# Altium schematic symbol library MCU_ST_STM32L4.SchLib: 319 symbols (part 6 of 8) (continued)
## STM32L471ZGJx
designator *  value STM32L471ZGJx  Reference: U
ki_keywords: Arm Cortex-M4 STM32L4 STM32L4x1; ki_description: STMicroelectronics Arm Cortex-M4 MCU, 1024KB flash, 128KB RAM, 80 MHz, 1.71-3.6V, 114 GPIO, UFBGA144; ki_fp_filters: *UFBGA*10x10mm*Layout12x12*P0.8mm*; Footprint: Package_BGA:UFBGA-144_10x10mm_Layout12x12_P0.8mm; Datasheet: https://www.st.com/resource/en/datasheet/stm32l471zg.pdf
pins: A1 VSS, A2 PE0, A3 PB8, A4 BOOT0, A5 PB7, A6 PG14, A7 PG12, A8 PD7, A9 PD6, A10 PD1, A11 PD0, A12 VSS hidden, B1 VBAT, B2 PE4, B3 PE3, B4 PE1, B5 PB6, B6 PG15, B7 PG11, B8 PD5, B9 PC12, B10 PC10, B11 PA12, B12 PA11, C1 PC15, C2 PE5, C3 PE2, C4 PB9, C5 PB5, C6 PB3, C7 PG9, C8 PD4, C9 PC11, C10 PA14, C11 PA13, C12 PA10, D1 PF4, D2 PC14, D3 PE6, D4 PC13, D5 PB4, D6 PG13, D7 PG10, D8 PD3, D9 PD2, D10 PA15, D11 PA9, D12 PA8, E1 PF6, E2 PF1, E3 PF0, E4 PF2, E5 VSS hidden, E6 VDDIO2, E7 VDD, E8 VSS hidden, E9 VDD, E10 PC6, E11 PC9, E12 PC8, F1 PF8, F2 PF7, F3 PF5, F4 PF3, F5 VDD, F6 VSS hidden, F7 VSS hidden, F8 VDDIO2, F9 PG7, F10 PG6, F11 PG8, F12 PC7, G1 PH1, G2 PH0, G3 PF10, G4 PF9, G5 VDD, G6 VSS hidden, G7 VSS hidden, G8 VDD, G9 PG4, G10 PD13, G11 PG3, G12 PG5, H1 PC2, H2 PC0, H3 PC1, H4 NRST, H5 VSS hidden, H6 VDD, H7 VDD, H8 VSS hidden, H9 PD12, H10 PD11, H11 PD14, H12 PG2, J1 VSSA, J2 VREF-, J3 PA0, J4 PC3, J5 PC4, J6 PF11, J7 PG1, J8 PE9, J9 PB13, J10 PB14, J11 PD10, J12 PD15, K1 VREF+, K2 VDDA, K3 PA1, K4 PA6, K5 PB2, K6 PF12, K7 PG0, K8 PE11, K9 PB11, K10 PB12, K11 PD8, K12 PD9, L1 OPAMP1_VINM, L2 PA2, L3 PA4, L4 OPAMP2_VINM, L5 PB0, L6 PF13, L7 PE8, L8 PE12, L9 PE13, L10 PE14, L11 PB10, L12 PB15, M1 VSS hidden, M2 PA3, M3 PA5, M4 PA7, M5 PC5, M6 PB1, M7 PF14, M8 PE7, M9 PF15, M10 PE10, M11 PE15, M12 VSS hidden

## STM32L471ZGTx
designator *  value STM32L471ZGTx  Reference: U
ki_keywords: Arm Cortex-M4 STM32L4 STM32L4x1; ki_description: STMicroelectronics Arm Cortex-M4 MCU, 1024KB flash, 128KB RAM, 80 MHz, 1.71-3.6V, 114 GPIO, LQFP144; ki_fp_filters: LQFP*20x20mm*P0.5mm*; Footprint: Package_QFP:LQFP-144_20x20mm_P0.5mm; Datasheet: https://www.st.com/resource/en/datasheet/stm32l471zg.pdf
pins: 1 PE2, 2 PE3, 3 PE4, 4 PE5, 5 PE6, 6 VBAT, 7 PC13, 8 PC14, 9 PC15, 10 PF0, 11 PF1, 12 PF2, 13 PF3, 14 PF4, 15 PF5, 16 VSS, 17 VDD, 18 PF6, 19 PF7, 20 PF8, 21 PF9, 22 PF10, 23 PH0, 24 PH1, 25 NRST, 26 PC0, 27 PC1, 28 PC2, 29 PC3, 30 VSSA, 31 VREF-, 32 VREF+, 33 VDDA, 34 PA0, 35 PA1, 36 PA2, 37 PA3, 38 VSS hidden, 39 VDD, 40 PA4, 41 PA5, 42 PA6, 43 PA7, 44 PC4, 45 PC5, 46 PB0, 47 PB1, 48 PB2, 49 PF11, 50 PF12, 51 VSS hidden, 52 VDD, 53 PF13, 54 PF14, 55 PF15, 56 PG0, 57 PG1, 58 PE7, 59 PE8, 60 PE9, 61 VSS hidden, 62 VDD, 63 PE10, 64 PE11, 65 PE12, 66 PE13, 67 PE14, 68 PE15, 69 PB10, 70 PB11, 71 VSS hidden, 72 VDD, 73 PB12, 74 PB13, 75 PB14, 76 PB15, 77 PD8, 78 PD9, 79 PD10, 80 PD11, 81 PD12, 82 PD13, 83 VSS hidden, 84 VDD, 85 PD14, 86 PD15, 87 PG2, 88 PG3, 89 PG4, 90 PG5, 91 PG6, 92 PG7, 93 PG8, 94 VSS hidden, 95 VDDIO2, 96 PC6, 97 PC7, 98 PC8, 99 PC9, 100 PA8, 101 PA9, 102 PA10, 103 PA11, 104 PA12, 105 PA13, 106 VDD, 107 VSS hidden, 108 VDD, 109 PA14, 110 PA15, 111 PC10, 112 PC11, 113 PC12, 114 PD0, 115 PD1, 116 PD2, 117 PD3, 118 PD4, 119 PD5, 120 VSS hidden, 121 VDD, 122 PD6, 123 PD7, 124 PG9, 125 PG10, 126 PG11, 127 PG12, 128 PG13, 129 PG14, 130 VSS hidden, 131 VDDIO2, 132 PG15, 133 PB3, 134 PB4, 135 PB5, 136 PB6, 137 PB7, 138 BOOT0, 139 PB8, 140 PB9, 141 PE0, 142 PE1, 143 VSS hidden, 144 VDD

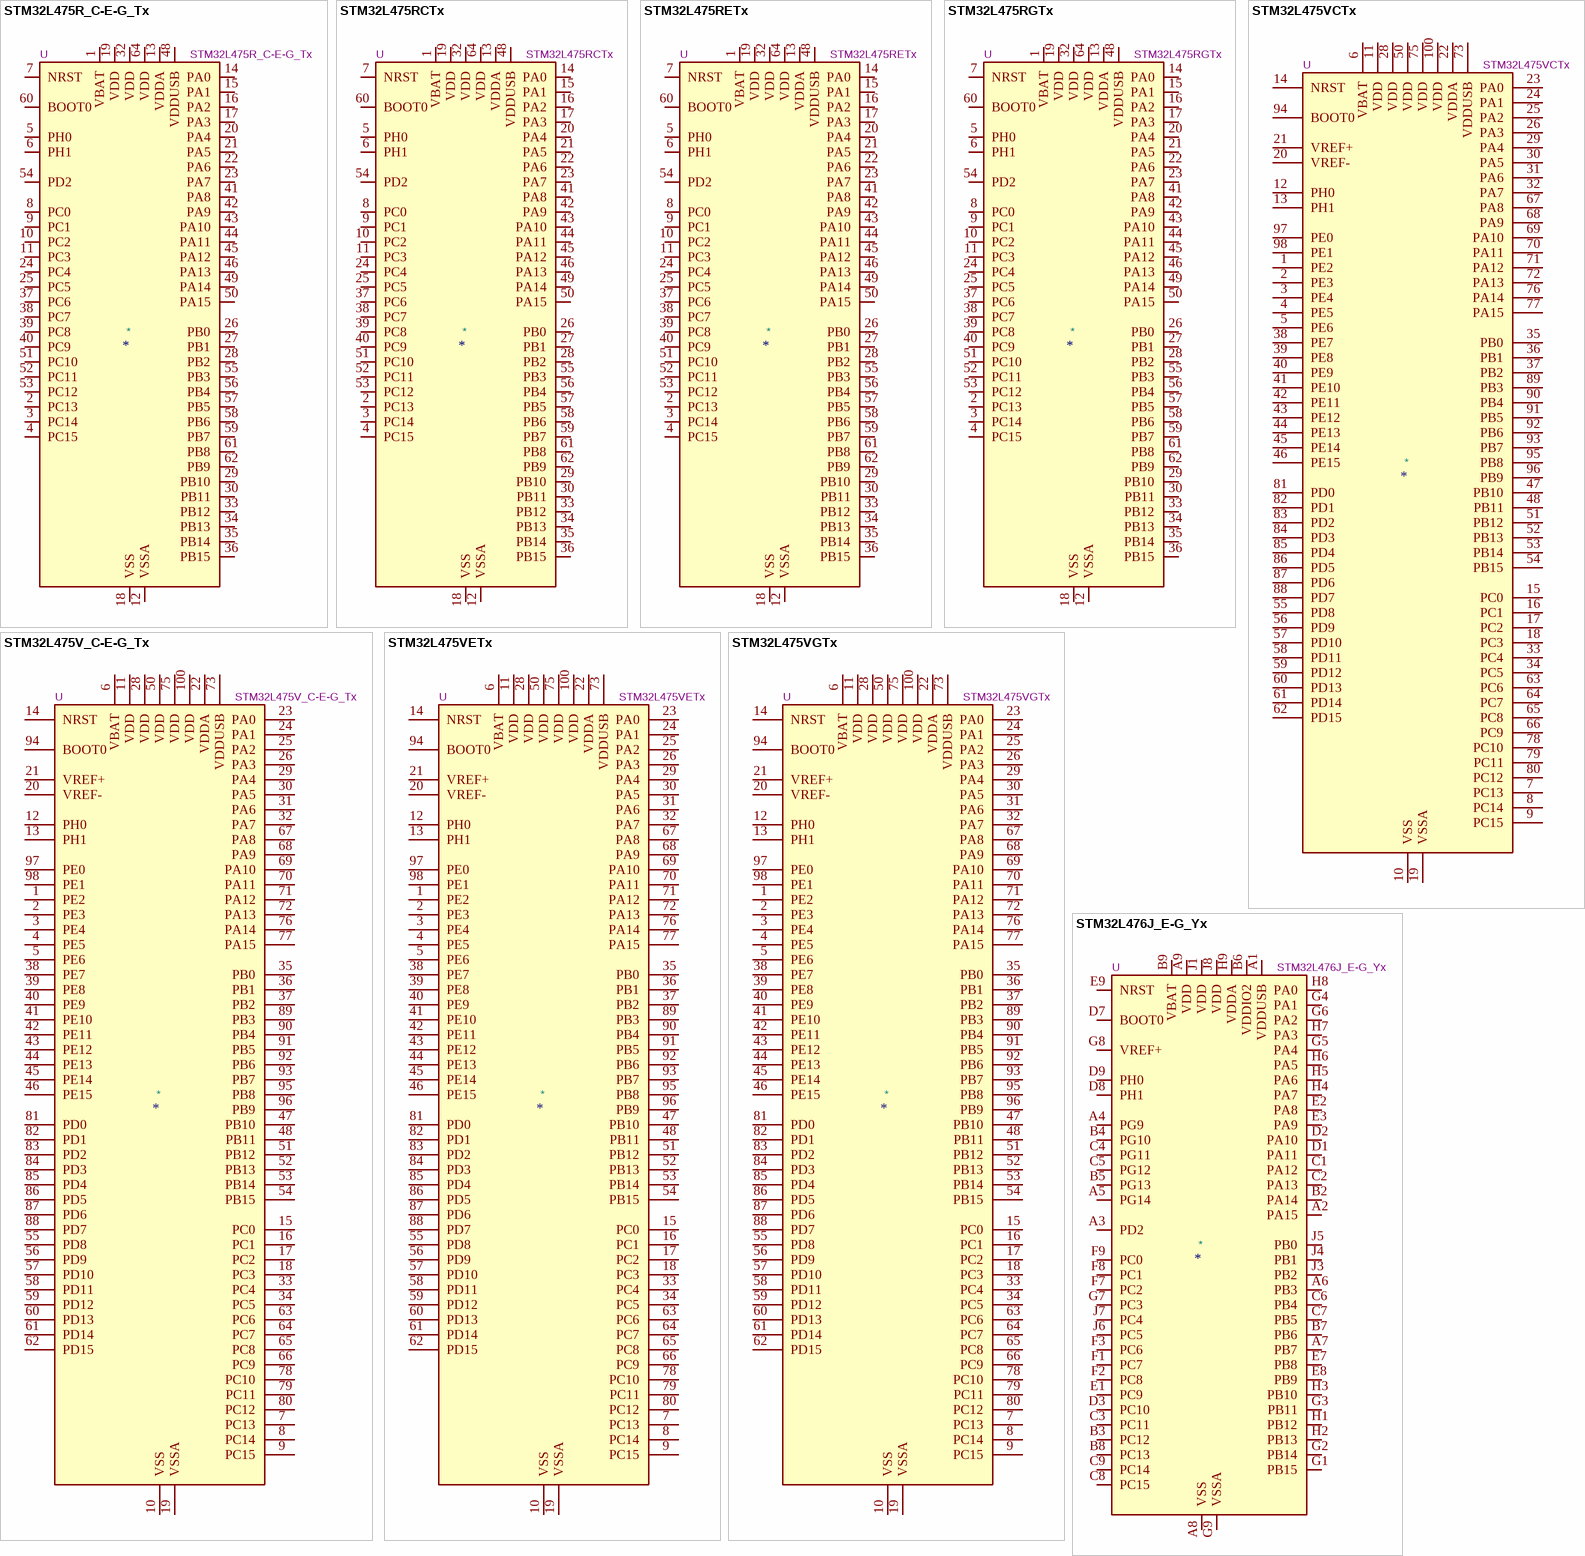
[diagram p48: symbols STM32L475R_C-E-G_Tx to STM32L476J_E-G_Yx]

## STM32L475R_C-E-G_Tx
designator *  value STM32L475R_C-E-G_Tx  Reference: U
ki_keywords: Arm Cortex-M4 STM32L4 STM32L4x5; ki_description: STMicroelectronics Arm Cortex-M4 MCU, 256-1024KB flash, 128KB RAM, 80 MHz, 1.71-3.6V, 51 GPIO, LQFP64; ki_fp_filters: LQFP*10x10mm*P0.5mm*; Footprint: Package_QFP:LQFP-64_10x10mm_P0.5mm; Datasheet: https://www.st.com/resource/en/datasheet/stm32l475rc.pdf
pins: 1 VBAT, 2 PC13, 3 PC14, 4 PC15, 5 PH0, 6 PH1, 7 NRST, 8 PC0, 9 PC1, 10 PC2, 11 PC3, 12 VSSA, 13 VDDA, 14 PA0, 15 PA1, 16 PA2, 17 PA3, 18 VSS, 19 VDD, 20 PA4, 21 PA5, 22 PA6, 23 PA7, 24 PC4, 25 PC5, 26 PB0, 27 PB1, 28 PB2, 29 PB10, 30 PB11, 31 VSS hidden, 32 VDD, 33 PB12, 34 PB13, 35 PB14, 36 PB15, 37 PC6, 38 PC7, 39 PC8, 40 PC9, 41 PA8, 42 PA9, 43 PA10, 44 PA11, 45 PA12, 46 PA13, 47 VSS hidden, 48 VDDUSB, 49 PA14, 50 PA15, 51 PC10, 52 PC11, 53 PC12, 54 PD2, 55 PB3, 56 PB4, 57 PB5, 58 PB6, 59 PB7, 60 BOOT0, 61 PB8, 62 PB9, 63 VSS hidden, 64 VDD

## STM32L475RCTx
designator *  value STM32L475RCTx  Reference: U
ki_keywords: Arm Cortex-M4 STM32L4 STM32L4x5; ki_description: STMicroelectronics Arm Cortex-M4 MCU, 256KB flash, 128KB RAM, 80 MHz, 1.71-3.6V, 51 GPIO, LQFP64; ki_fp_filters: LQFP*10x10mm*P0.5mm*; Footprint: Package_QFP:LQFP-64_10x10mm_P0.5mm; Datasheet: https://www.st.com/resource/en/datasheet/stm32l475rc.pdf
pins: 1 VBAT, 2 PC13, 3 PC14, 4 PC15, 5 PH0, 6 PH1, 7 NRST, 8 PC0, 9 PC1, 10 PC2, 11 PC3, 12 VSSA, 13 VDDA, 14 PA0, 15 PA1, 16 PA2, 17 PA3, 18 VSS, 19 VDD, 20 PA4, 21 PA5, 22 PA6, 23 PA7, 24 PC4, 25 PC5, 26 PB0, 27 PB1, 28 PB2, 29 PB10, 30 PB11, 31 VSS hidden, 32 VDD, 33 PB12, 34 PB13, 35 PB14, 36 PB15, 37 PC6, 38 PC7, 39 PC8, 40 PC9, 41 PA8, 42 PA9, 43 PA10, 44 PA11, 45 PA12, 46 PA13, 47 VSS hidden, 48 VDDUSB, 49 PA14, 50 PA15, 51 PC10, 52 PC11, 53 PC12, 54 PD2, 55 PB3, 56 PB4, 57 PB5, 58 PB6, 59 PB7, 60 BOOT0, 61 PB8, 62 PB9, 63 VSS hidden, 64 VDD

## STM32L475RETx
designator *  value STM32L475RETx  Reference: U
ki_keywords: Arm Cortex-M4 STM32L4 STM32L4x5; ki_description: STMicroelectronics Arm Cortex-M4 MCU, 512KB flash, 128KB RAM, 80 MHz, 1.71-3.6V, 51 GPIO, LQFP64; ki_fp_filters: LQFP*10x10mm*P0.5mm*; Footprint: Package_QFP:LQFP-64_10x10mm_P0.5mm; Datasheet: https://www.st.com/resource/en/datasheet/stm32l475re.pdf
pins: 1 VBAT, 2 PC13, 3 PC14, 4 PC15, 5 PH0, 6 PH1, 7 NRST, 8 PC0, 9 PC1, 10 PC2, 11 PC3, 12 VSSA, 13 VDDA, 14 PA0, 15 PA1, 16 PA2, 17 PA3, 18 VSS, 19 VDD, 20 PA4, 21 PA5, 22 PA6, 23 PA7, 24 PC4, 25 PC5, 26 PB0, 27 PB1, 28 PB2, 29 PB10, 30 PB11, 31 VSS hidden, 32 VDD, 33 PB12, 34 PB13, 35 PB14, 36 PB15, 37 PC6, 38 PC7, 39 PC8, 40 PC9, 41 PA8, 42 PA9, 43 PA10, 44 PA11, 45 PA12, 46 PA13, 47 VSS hidden, 48 VDDUSB, 49 PA14, 50 PA15, 51 PC10, 52 PC11, 53 PC12, 54 PD2, 55 PB3, 56 PB4, 57 PB5, 58 PB6, 59 PB7, 60 BOOT0, 61 PB8, 62 PB9, 63 VSS hidden, 64 VDD

## STM32L475RGTx
designator *  value STM32L475RGTx  Reference: U
ki_keywords: Arm Cortex-M4 STM32L4 STM32L4x5; ki_description: STMicroelectronics Arm Cortex-M4 MCU, 1024KB flash, 128KB RAM, 80 MHz, 1.71-3.6V, 51 GPIO, LQFP64; ki_fp_filters: LQFP*10x10mm*P0.5mm*; Footprint: Package_QFP:LQFP-64_10x10mm_P0.5mm; Datasheet: https://www.st.com/resource/en/datasheet/stm32l475rg.pdf
pins: 1 VBAT, 2 PC13, 3 PC14, 4 PC15, 5 PH0, 6 PH1, 7 NRST, 8 PC0, 9 PC1, 10 PC2, 11 PC3, 12 VSSA, 13 VDDA, 14 PA0, 15 PA1, 16 PA2, 17 PA3, 18 VSS, 19 VDD, 20 PA4, 21 PA5, 22 PA6, 23 PA7, 24 PC4, 25 PC5, 26 PB0, 27 PB1, 28 PB2, 29 PB10, 30 PB11, 31 VSS hidden, 32 VDD, 33 PB12, 34 PB13, 35 PB14, 36 PB15, 37 PC6, 38 PC7, 39 PC8, 40 PC9, 41 PA8, 42 PA9, 43 PA10, 44 PA11, 45 PA12, 46 PA13, 47 VSS hidden, 48 VDDUSB, 49 PA14, 50 PA15, 51 PC10, 52 PC11, 53 PC12, 54 PD2, 55 PB3, 56 PB4, 57 PB5, 58 PB6, 59 PB7, 60 BOOT0, 61 PB8, 62 PB9, 63 VSS hidden, 64 VDD

## STM32L475V_C-E-G_Tx
designator *  value STM32L475V_C-E-G_Tx  Reference: U
ki_keywords: Arm Cortex-M4 STM32L4 STM32L4x5; ki_description: STMicroelectronics Arm Cortex-M4 MCU, 256-1024KB flash, 128KB RAM, 80 MHz, 1.71-3.6V, 82 GPIO, LQFP100; ki_fp_filters: LQFP*14x14mm*P0.5mm*; Footprint: Package_QFP:LQFP-100_14x14mm_P0.5mm; Datasheet: https://www.st.com/resource/en/datasheet/stm32l475vc.pdf
pins: 1 PE2, 2 PE3, 3 PE4, 4 PE5, 5 PE6, 6 VBAT, 7 PC13, 8 PC14, 9 PC15, 10 VSS, 11 VDD, 12 PH0, 13 PH1, 14 NRST, 15 PC0, 16 PC1, 17 PC2, 18 PC3, 19 VSSA, 20 VREF-, 21 VREF+, 22 VDDA, 23 PA0, 24 PA1, 25 PA2, 26 PA3, 27 VSS hidden, 28 VDD, 29 PA4, 30 PA5, 31 PA6, 32 PA7, 33 PC4, 34 PC5, 35 PB0, 36 PB1, 37 PB2, 38 PE7, 39 PE8, 40 PE9, 41 PE10, 42 PE11, 43 PE12, 44 PE13, 45 PE14, 46 PE15, 47 PB10, 48 PB11, 49 VSS hidden, 50 VDD, 51 PB12, 52 PB13, 53 PB14, 54 PB15, 55 PD8, 56 PD9, 57 PD10, 58 PD11, 59 PD12, 60 PD13, 61 PD14, 62 PD15, 63 PC6, 64 PC7, 65 PC8, 66 PC9, 67 PA8, 68 PA9, 69 PA10, 70 PA11, 71 PA12, 72 PA13, 73 VDDUSB, 74 VSS hidden, 75 VDD, 76 PA14, 77 PA15, 78 PC10, 79 PC11, 80 PC12, 81 PD0, 82 PD1, 83 PD2, 84 PD3, 85 PD4, 86 PD5, 87 PD6, 88 PD7, 89 PB3, 90 PB4, 91 PB5, 92 PB6, 93 PB7, 94 BOOT0, 95 PB8, 96 PB9, 97 PE0, 98 PE1, 99 VSS hidden, 100 VDD

## STM32L475VCTx
designator *  value STM32L475VCTx  Reference: U
ki_keywords: Arm Cortex-M4 STM32L4 STM32L4x5; ki_description: STMicroelectronics Arm Cortex-M4 MCU, 256KB flash, 128KB RAM, 80 MHz, 1.71-3.6V, 82 GPIO, LQFP100; ki_fp_filters: LQFP*14x14mm*P0.5mm*; Footprint: Package_QFP:LQFP-100_14x14mm_P0.5mm; Datasheet: https://www.st.com/resource/en/datasheet/stm32l475vc.pdf
pins: 1 PE2, 2 PE3, 3 PE4, 4 PE5, 5 PE6, 6 VBAT, 7 PC13, 8 PC14, 9 PC15, 10 VSS, 11 VDD, 12 PH0, 13 PH1, 14 NRST, 15 PC0, 16 PC1, 17 PC2, 18 PC3, 19 VSSA, 20 VREF-, 21 VREF+, 22 VDDA, 23 PA0, 24 PA1, 25 PA2, 26 PA3, 27 VSS hidden, 28 VDD, 29 PA4, 30 PA5, 31 PA6, 32 PA7, 33 PC4, 34 PC5, 35 PB0, 36 PB1, 37 PB2, 38 PE7, 39 PE8, 40 PE9, 41 PE10, 42 PE11, 43 PE12, 44 PE13, 45 PE14, 46 PE15, 47 PB10, 48 PB11, 49 VSS hidden, 50 VDD, 51 PB12, 52 PB13, 53 PB14, 54 PB15, 55 PD8, 56 PD9, 57 PD10, 58 PD11, 59 PD12, 60 PD13, 61 PD14, 62 PD15, 63 PC6, 64 PC7, 65 PC8, 66 PC9, 67 PA8, 68 PA9, 69 PA10, 70 PA11, 71 PA12, 72 PA13, 73 VDDUSB, 74 VSS hidden, 75 VDD, 76 PA14, 77 PA15, 78 PC10, 79 PC11, 80 PC12, 81 PD0, 82 PD1, 83 PD2, 84 PD3, 85 PD4, 86 PD5, 87 PD6, 88 PD7, 89 PB3, 90 PB4, 91 PB5, 92 PB6, 93 PB7, 94 BOOT0, 95 PB8, 96 PB9, 97 PE0, 98 PE1, 99 VSS hidden, 100 VDD

## STM32L475VETx
designator *  value STM32L475VETx  Reference: U
ki_keywords: Arm Cortex-M4 STM32L4 STM32L4x5; ki_description: STMicroelectronics Arm Cortex-M4 MCU, 512KB flash, 128KB RAM, 80 MHz, 1.71-3.6V, 82 GPIO, LQFP100; ki_fp_filters: LQFP*14x14mm*P0.5mm*; Footprint: Package_QFP:LQFP-100_14x14mm_P0.5mm; Datasheet: https://www.st.com/resource/en/datasheet/stm32l475ve.pdf
pins: 1 PE2, 2 PE3, 3 PE4, 4 PE5, 5 PE6, 6 VBAT, 7 PC13, 8 PC14, 9 PC15, 10 VSS, 11 VDD, 12 PH0, 13 PH1, 14 NRST, 15 PC0, 16 PC1, 17 PC2, 18 PC3, 19 VSSA, 20 VREF-, 21 VREF+, 22 VDDA, 23 PA0, 24 PA1, 25 PA2, 26 PA3, 27 VSS hidden, 28 VDD, 29 PA4, 30 PA5, 31 PA6, 32 PA7, 33 PC4, 34 PC5, 35 PB0, 36 PB1, 37 PB2, 38 PE7, 39 PE8, 40 PE9, 41 PE10, 42 PE11, 43 PE12, 44 PE13, 45 PE14, 46 PE15, 47 PB10, 48 PB11, 49 VSS hidden, 50 VDD, 51 PB12, 52 PB13, 53 PB14, 54 PB15, 55 PD8, 56 PD9, 57 PD10, 58 PD11, 59 PD12, 60 PD13, 61 PD14, 62 PD15, 63 PC6, 64 PC7, 65 PC8, 66 PC9, 67 PA8, 68 PA9, 69 PA10, 70 PA11, 71 PA12, 72 PA13, 73 VDDUSB, 74 VSS hidden, 75 VDD, 76 PA14, 77 PA15, 78 PC10, 79 PC11, 80 PC12, 81 PD0, 82 PD1, 83 PD2, 84 PD3, 85 PD4, 86 PD5, 87 PD6, 88 PD7, 89 PB3, 90 PB4, 91 PB5, 92 PB6, 93 PB7, 94 BOOT0, 95 PB8, 96 PB9, 97 PE0, 98 PE1, 99 VSS hidden, 100 VDD

## STM32L475VGTx
designator *  value STM32L475VGTx  Reference: U
ki_keywords: Arm Cortex-M4 STM32L4 STM32L4x5; ki_description: STMicroelectronics Arm Cortex-M4 MCU, 1024KB flash, 128KB RAM, 80 MHz, 1.71-3.6V, 82 GPIO, LQFP100; ki_fp_filters: LQFP*14x14mm*P0.5mm*; Footprint: Package_QFP:LQFP-100_14x14mm_P0.5mm; Datasheet: https://www.st.com/resource/en/datasheet/stm32l475vg.pdf
pins: 1 PE2, 2 PE3, 3 PE4, 4 PE5, 5 PE6, 6 VBAT, 7 PC13, 8 PC14, 9 PC15, 10 VSS, 11 VDD, 12 PH0, 13 PH1, 14 NRST, 15 PC0, 16 PC1, 17 PC2, 18 PC3, 19 VSSA, 20 VREF-, 21 VREF+, 22 VDDA, 23 PA0, 24 PA1, 25 PA2, 26 PA3, 27 VSS hidden, 28 VDD, 29 PA4, 30 PA5, 31 PA6, 32 PA7, 33 PC4, 34 PC5, 35 PB0, 36 PB1, 37 PB2, 38 PE7, 39 PE8, 40 PE9, 41 PE10, 42 PE11, 43 PE12, 44 PE13, 45 PE14, 46 PE15, 47 PB10, 48 PB11, 49 VSS hidden, 50 VDD, 51 PB12, 52 PB13, 53 PB14, 54 PB15, 55 PD8, 56 PD9, 57 PD10, 58 PD11, 59 PD12, 60 PD13, 61 PD14, 62 PD15, 63 PC6, 64 PC7, 65 PC8, 66 PC9, 67 PA8, 68 PA9, 69 PA10, 70 PA11, 71 PA12, 72 PA13, 73 VDDUSB, 74 VSS hidden, 75 VDD, 76 PA14, 77 PA15, 78 PC10, 79 PC11, 80 PC12, 81 PD0, 82 PD1, 83 PD2, 84 PD3, 85 PD4, 86 PD5, 87 PD6, 88 PD7, 89 PB3, 90 PB4, 91 PB5, 92 PB6, 93 PB7, 94 BOOT0, 95 PB8, 96 PB9, 97 PE0, 98 PE1, 99 VSS hidden, 100 VDD

## STM32L476J_E-G_Yx
designator *  value STM32L476J_E-G_Yx  Reference: U
ki_keywords: Arm Cortex-M4 STM32L4 STM32L4x6; ki_description: STMicroelectronics Arm Cortex-M4 MCU, 512-1024KB flash, 128KB RAM, 80 MHz, 1.71-3.6V, 57 GPIO, WLCSP72; ki_fp_filters: ST*WLCSP*Die415*; Footprint: Package_CSP:ST_WLCSP-72_Die415; Datasheet: https://www.st.com/resource/en/datasheet/stm32l476je.pdf
pins: A1 VDDUSB, A2 PA15, A3 PD2, A4 PG9, A5 PG14, A6 PB3, A7 PB7, A8 VSS, A9 VDD, B1 VSS hidden, B2 PA14, B3 PC12, B4 PG10, B5 PG13, B6 VDDIO2, B7 PB6, B8 PC13, B9 VBAT, C1 PA12, C2 PA13, C3 PC11, C4 PG11, C5 PG12, C6 PB4, C7 PB5, C8 PC15, C9 PC14, D1 PA11, D2 PA10, D3 PC10, D7 BOOT0, D8 PH1, D9 PH0, E1 PC9, E2 PA8, E3 PA9, E7 PB8, E8 PB9, E9 NRST, F1 PC7, F2 PC8, F3 PC6, F7 PC2, F8 PC1, F9 PC0, G1 PB15, G2 PB14, G3 PB11, G4 PA1, G5 PA4, G6 PA2, G7 PC3, G8 VREF+, G9 VSSA, H1 PB12, H2 PB13, H3 PB10, H4 PA7, H5 PA6, H6 PA5, H7 PA3, H8 PA0, H9 VDDA, J1 VDD, J2 VSS hidden, J3 PB2, J4 PB1, J5 PB0, J6 PC5, J7 PC4, J8 VDD, J9 VSS hidden

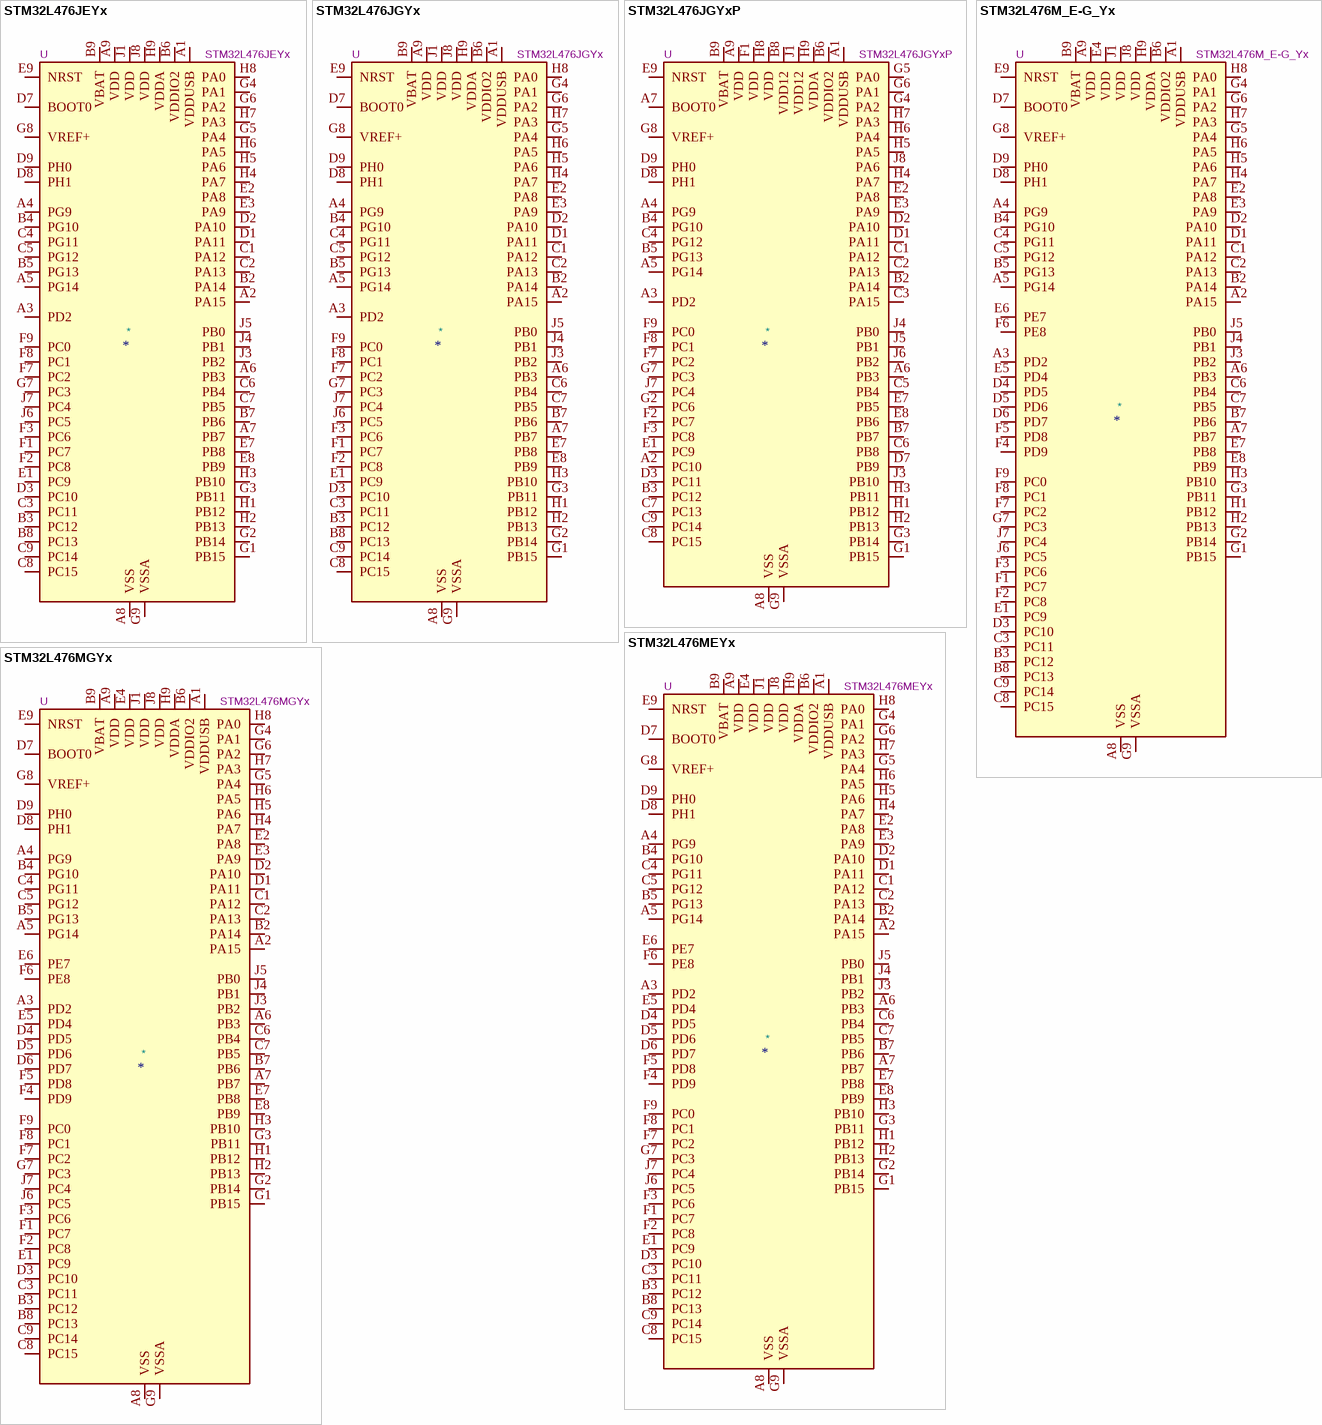
[diagram p49: symbols STM32L476JEYx to STM32L476MGYx]

## STM32L476JEYx
designator *  value STM32L476JEYx  Reference: U
ki_keywords: Arm Cortex-M4 STM32L4 STM32L4x6; ki_description: STMicroelectronics Arm Cortex-M4 MCU, 512KB flash, 128KB RAM, 80 MHz, 1.71-3.6V, 57 GPIO, WLCSP72; ki_fp_filters: ST*WLCSP*Die415*; Footprint: Package_CSP:ST_WLCSP-72_Die415; Datasheet: https://www.st.com/resource/en/datasheet/stm32l476je.pdf
pins: A1 VDDUSB, A2 PA15, A3 PD2, A4 PG9, A5 PG14, A6 PB3, A7 PB7, A8 VSS, A9 VDD, B1 VSS hidden, B2 PA14, B3 PC12, B4 PG10, B5 PG13, B6 VDDIO2, B7 PB6, B8 PC13, B9 VBAT, C1 PA12, C2 PA13, C3 PC11, C4 PG11, C5 PG12, C6 PB4, C7 PB5, C8 PC15, C9 PC14, D1 PA11, D2 PA10, D3 PC10, D7 BOOT0, D8 PH1, D9 PH0, E1 PC9, E2 PA8, E3 PA9, E7 PB8, E8 PB9, E9 NRST, F1 PC7, F2 PC8, F3 PC6, F7 PC2, F8 PC1, F9 PC0, G1 PB15, G2 PB14, G3 PB11, G4 PA1, G5 PA4, G6 PA2, G7 PC3, G8 VREF+, G9 VSSA, H1 PB12, H2 PB13, H3 PB10, H4 PA7, H5 PA6, H6 PA5, H7 PA3, H8 PA0, H9 VDDA, J1 VDD, J2 VSS hidden, J3 PB2, J4 PB1, J5 PB0, J6 PC5, J7 PC4, J8 VDD, J9 VSS hidden

## STM32L476JGYx
designator *  value STM32L476JGYx  Reference: U
ki_keywords: Arm Cortex-M4 STM32L4 STM32L4x6; ki_description: STMicroelectronics Arm Cortex-M4 MCU, 1024KB flash, 128KB RAM, 80 MHz, 1.71-3.6V, 57 GPIO, WLCSP72; ki_fp_filters: ST*WLCSP*Die415*; Footprint: Package_CSP:ST_WLCSP-72_Die415; Datasheet: https://www.st.com/resource/en/datasheet/stm32l476jg.pdf
pins: A1 VDDUSB, A2 PA15, A3 PD2, A4 PG9, A5 PG14, A6 PB3, A7 PB7, A8 VSS, A9 VDD, B1 VSS hidden, B2 PA14, B3 PC12, B4 PG10, B5 PG13, B6 VDDIO2, B7 PB6, B8 PC13, B9 VBAT, C1 PA12, C2 PA13, C3 PC11, C4 PG11, C5 PG12, C6 PB4, C7 PB5, C8 PC15, C9 PC14, D1 PA11, D2 PA10, D3 PC10, D7 BOOT0, D8 PH1, D9 PH0, E1 PC9, E2 PA8, E3 PA9, E7 PB8, E8 PB9, E9 NRST, F1 PC7, F2 PC8, F3 PC6, F7 PC2, F8 PC1, F9 PC0, G1 PB15, G2 PB14, G3 PB11, G4 PA1, G5 PA4, G6 PA2, G7 PC3, G8 VREF+, G9 VSSA, H1 PB12, H2 PB13, H3 PB10, H4 PA7, H5 PA6, H6 PA5, H7 PA3, H8 PA0, H9 VDDA, J1 VDD, J2 VSS hidden, J3 PB2, J4 PB1, J5 PB0, J6 PC5, J7 PC4, J8 VDD, J9 VSS hidden

## STM32L476JGYxP
designator *  value STM32L476JGYxP  Reference: U
ki_keywords: Arm Cortex-M4 STM32L4 STM32L4x6; ki_description: STMicroelectronics Arm Cortex-M4 MCU, 1024KB flash, 128KB RAM, 80 MHz, 1.71-3.6V, 55 GPIO, WLCSP72; ki_fp_filters: ST*WLCSP*Die415*; Footprint: Package_CSP:ST_WLCSP-72_Die415; Datasheet: https://www.st.com/resource/en/datasheet/stm32l476jg.pdf
pins: A1 VDDUSB, A2 PC10, A3 PD2, A4 PG9, A5 PG14, A6 PB3, A7 BOOT0, A8 VSS, A9 VDD, B1 VSS hidden, B2 PA14, B3 PC12, B4 PG10, B5 PG13, B6 VDDIO2, B7 PB7, B8 VDD12, B9 VBAT, C1 PA12, C2 PA13, C3 PA15, C4 PG12, C5 PB4, C6 PB8, C7 PC13, C8 PC15, C9 PC14, D1 PA11, D2 PA10, D3 PC11, D7 PB9, D8 PH1, D9 PH0, E1 PC9, E2 PA8, E3 PA9, E7 PB5, E8 PB6, E9 NRST, F1 VDD, F2 PC7, F3 PC8, F7 PC2, F8 PC1, F9 PC0, G1 PB15, G2 PC6, G3 PB14, G4 PA2, G5 PA0, G6 PA1, G7 PC3, G8 VREF+, G9 VSSA, H1 PB12, H2 PB13, H3 PB11, H4 PA7, H5 PA5, H6 PA4, H7 PA3, H8 VDD, H9 VDDA, J1 VDD12, J2 VSS hidden, J3 PB10, J4 PB0, J5 PB1, J6 PB2, J7 PC4, J8 PA6, J9 VSS hidden

## STM32L476M_E-G_Yx
designator *  value STM32L476M_E-G_Yx  Reference: U
ki_keywords: Arm Cortex-M4 STM32L4 STM32L4x6; ki_description: STMicroelectronics Arm Cortex-M4 MCU, 512-1024KB flash, 128KB RAM, 80 MHz, 1.71-3.6V, 65 GPIO, WLCSP81; ki_fp_filters: ST*WLCSP*Die415*; Footprint: Package_CSP:ST_WLCSP-81_Die415; Datasheet: https://www.st.com/resource/en/datasheet/stm32l476me.pdf
pins: A1 VDDUSB, A2 PA15, A3 PD2, A4 PG9, A5 PG14, A6 PB3, A7 PB7, A8 VSS, A9 VDD, B1 VSS hidden, B2 PA14, B3 PC12, B4 PG10, B5 PG13, B6 VDDIO2, B7 PB6, B8 PC13, B9 VBAT, C1 PA12, C2 PA13, C3 PC11, C4 PG11, C5 PG12, C6 PB4, C7 PB5, C8 PC15, C9 PC14, D1 PA11, D2 PA10, D3 PC10, D4 PD5, D5 PD6, D6 PD7, D7 BOOT0, D8 PH1, D9 PH0, E1 PC9, E2 PA8, E3 PA9, E4 VDD, E5 PD4, E6 PE7, E7 PB8, E8 PB9, E9 NRST, F1 PC7, F2 PC8, F3 PC6, F4 PD9, F5 PD8, F6 PE8, F7 PC2, F8 PC1, F9 PC0, G1 PB15, G2 PB14, G3 PB11, G4 PA1, G5 PA4, G6 PA2, G7 PC3, G8 VREF+, G9 VSSA, H1 PB12, H2 PB13, H3 PB10, H4 PA7, H5 PA6, H6 PA5, H7 PA3, H8 PA0, H9 VDDA, J1 VDD, J2 VSS hidden, J3 PB2, J4 PB1, J5 PB0, J6 PC5, J7 PC4, J8 VDD, J9 VSS hidden

## STM32L476MEYx
designator *  value STM32L476MEYx  Reference: U
ki_keywords: Arm Cortex-M4 STM32L4 STM32L4x6; ki_description: STMicroelectronics Arm Cortex-M4 MCU, 512KB flash, 128KB RAM, 80 MHz, 1.71-3.6V, 65 GPIO, WLCSP81; ki_fp_filters: ST*WLCSP*Die415*; Footprint: Package_CSP:ST_WLCSP-81_Die415; Datasheet: https://www.st.com/resource/en/datasheet/stm32l476me.pdf
pins: A1 VDDUSB, A2 PA15, A3 PD2, A4 PG9, A5 PG14, A6 PB3, A7 PB7, A8 VSS, A9 VDD, B1 VSS hidden, B2 PA14, B3 PC12, B4 PG10, B5 PG13, B6 VDDIO2, B7 PB6, B8 PC13, B9 VBAT, C1 PA12, C2 PA13, C3 PC11, C4 PG11, C5 PG12, C6 PB4, C7 PB5, C8 PC15, C9 PC14, D1 PA11, D2 PA10, D3 PC10, D4 PD5, D5 PD6, D6 PD7, D7 BOOT0, D8 PH1, D9 PH0, E1 PC9, E2 PA8, E3 PA9, E4 VDD, E5 PD4, E6 PE7, E7 PB8, E8 PB9, E9 NRST, F1 PC7, F2 PC8, F3 PC6, F4 PD9, F5 PD8, F6 PE8, F7 PC2, F8 PC1, F9 PC0, G1 PB15, G2 PB14, G3 PB11, G4 PA1, G5 PA4, G6 PA2, G7 PC3, G8 VREF+, G9 VSSA, H1 PB12, H2 PB13, H3 PB10, H4 PA7, H5 PA6, H6 PA5, H7 PA3, H8 PA0, H9 VDDA, J1 VDD, J2 VSS hidden, J3 PB2, J4 PB1, J5 PB0, J6 PC5, J7 PC4, J8 VDD, J9 VSS hidden

## STM32L476MGYx
designator *  value STM32L476MGYx  Reference: U
ki_keywords: Arm Cortex-M4 STM32L4 STM32L4x6; ki_description: STMicroelectronics Arm Cortex-M4 MCU, 1024KB flash, 128KB RAM, 80 MHz, 1.71-3.6V, 65 GPIO, WLCSP81; ki_fp_filters: ST*WLCSP*Die415*; Footprint: Package_CSP:ST_WLCSP-81_Die415; Datasheet: https://www.st.com/resource/en/datasheet/stm32l476mg.pdf
pins: A1 VDDUSB, A2 PA15, A3 PD2, A4 PG9, A5 PG14, A6 PB3, A7 PB7, A8 VSS, A9 VDD, B1 VSS hidden, B2 PA14, B3 PC12, B4 PG10, B5 PG13, B6 VDDIO2, B7 PB6, B8 PC13, B9 VBAT, C1 PA12, C2 PA13, C3 PC11, C4 PG11, C5 PG12, C6 PB4, C7 PB5, C8 PC15, C9 PC14, D1 PA11, D2 PA10, D3 PC10, D4 PD5, D5 PD6, D6 PD7, D7 BOOT0, D8 PH1, D9 PH0, E1 PC9, E2 PA8, E3 PA9, E4 VDD, E5 PD4, E6 PE7, E7 PB8, E8 PB9, E9 NRST, F1 PC7, F2 PC8, F3 PC6, F4 PD9, F5 PD8, F6 PE8, F7 PC2, F8 PC1, F9 PC0, G1 PB15, G2 PB14, G3 PB11, G4 PA1, G5 PA4, G6 PA2, G7 PC3, G8 VREF+, G9 VSSA, H1 PB12, H2 PB13, H3 PB10, H4 PA7, H5 PA6, H6 PA5, H7 PA3, H8 PA0, H9 VDDA, J1 VDD, J2 VSS hidden, J3 PB2, J4 PB1, J5 PB0, J6 PC5, J7 PC4, J8 VDD, J9 VSS hidden

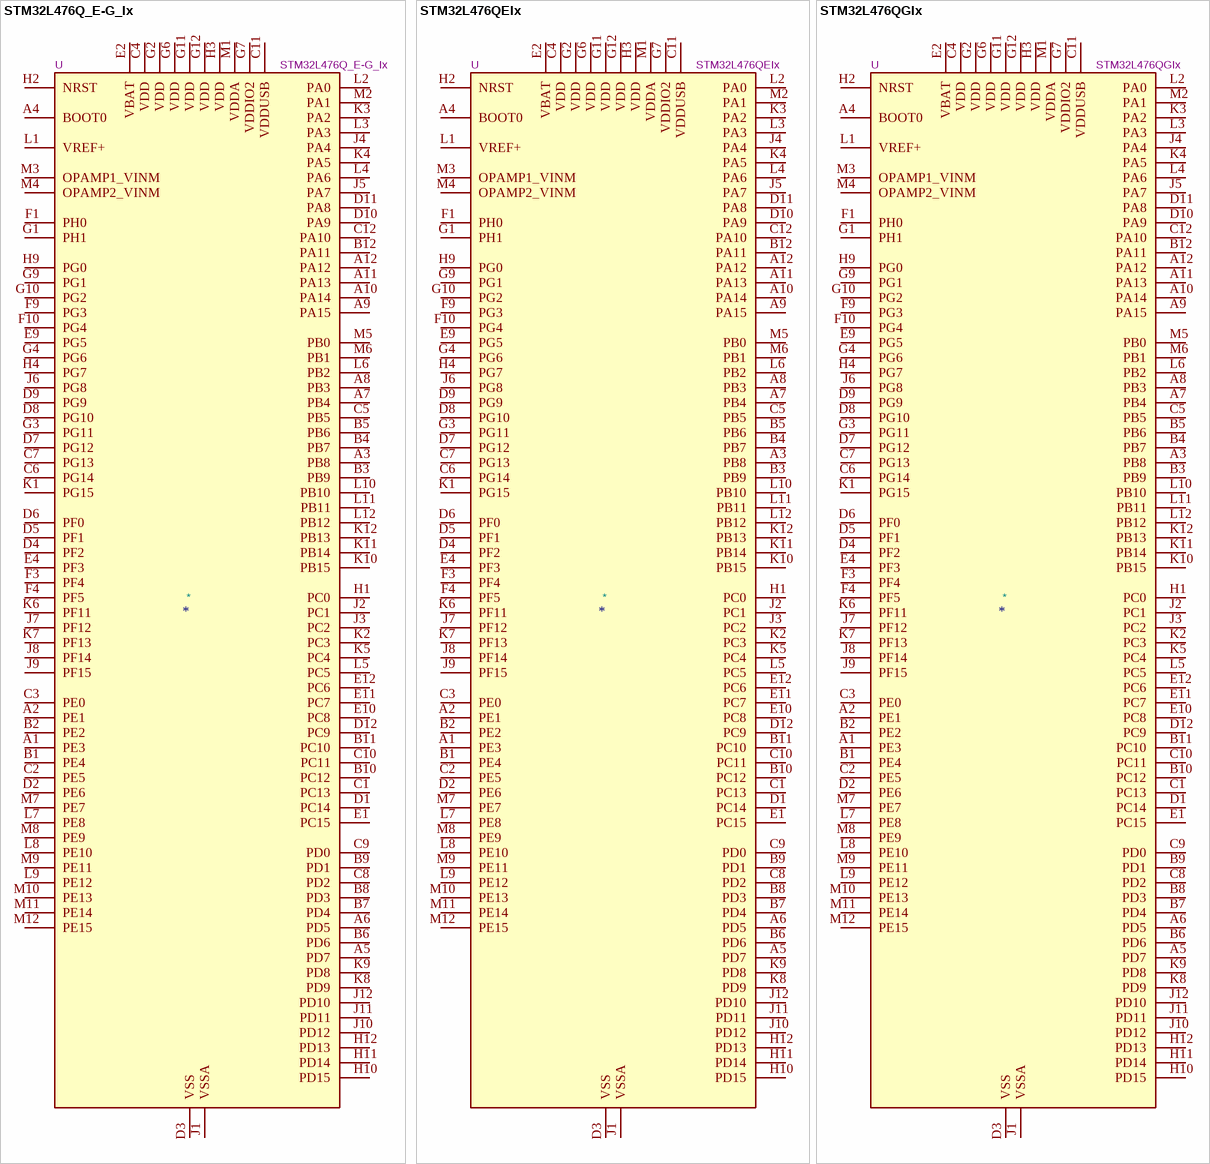
[diagram p50: symbols STM32L476Q_E-G_Ix to STM32L476QGIx]